# Altium footprint library ZLS_Lib.PcbLib: 157 footprints (part 7 of 10)
Each footprint in its own frame and in the unit in brackets; x right, y up, seen from the top. Pads: shape width x height; smd on the part's side, far side on the other; paste and mask are expansions set on the pad; w line width, h text height; cw(c..) or ccw(c..) is an arc to the next point about the centre after c.
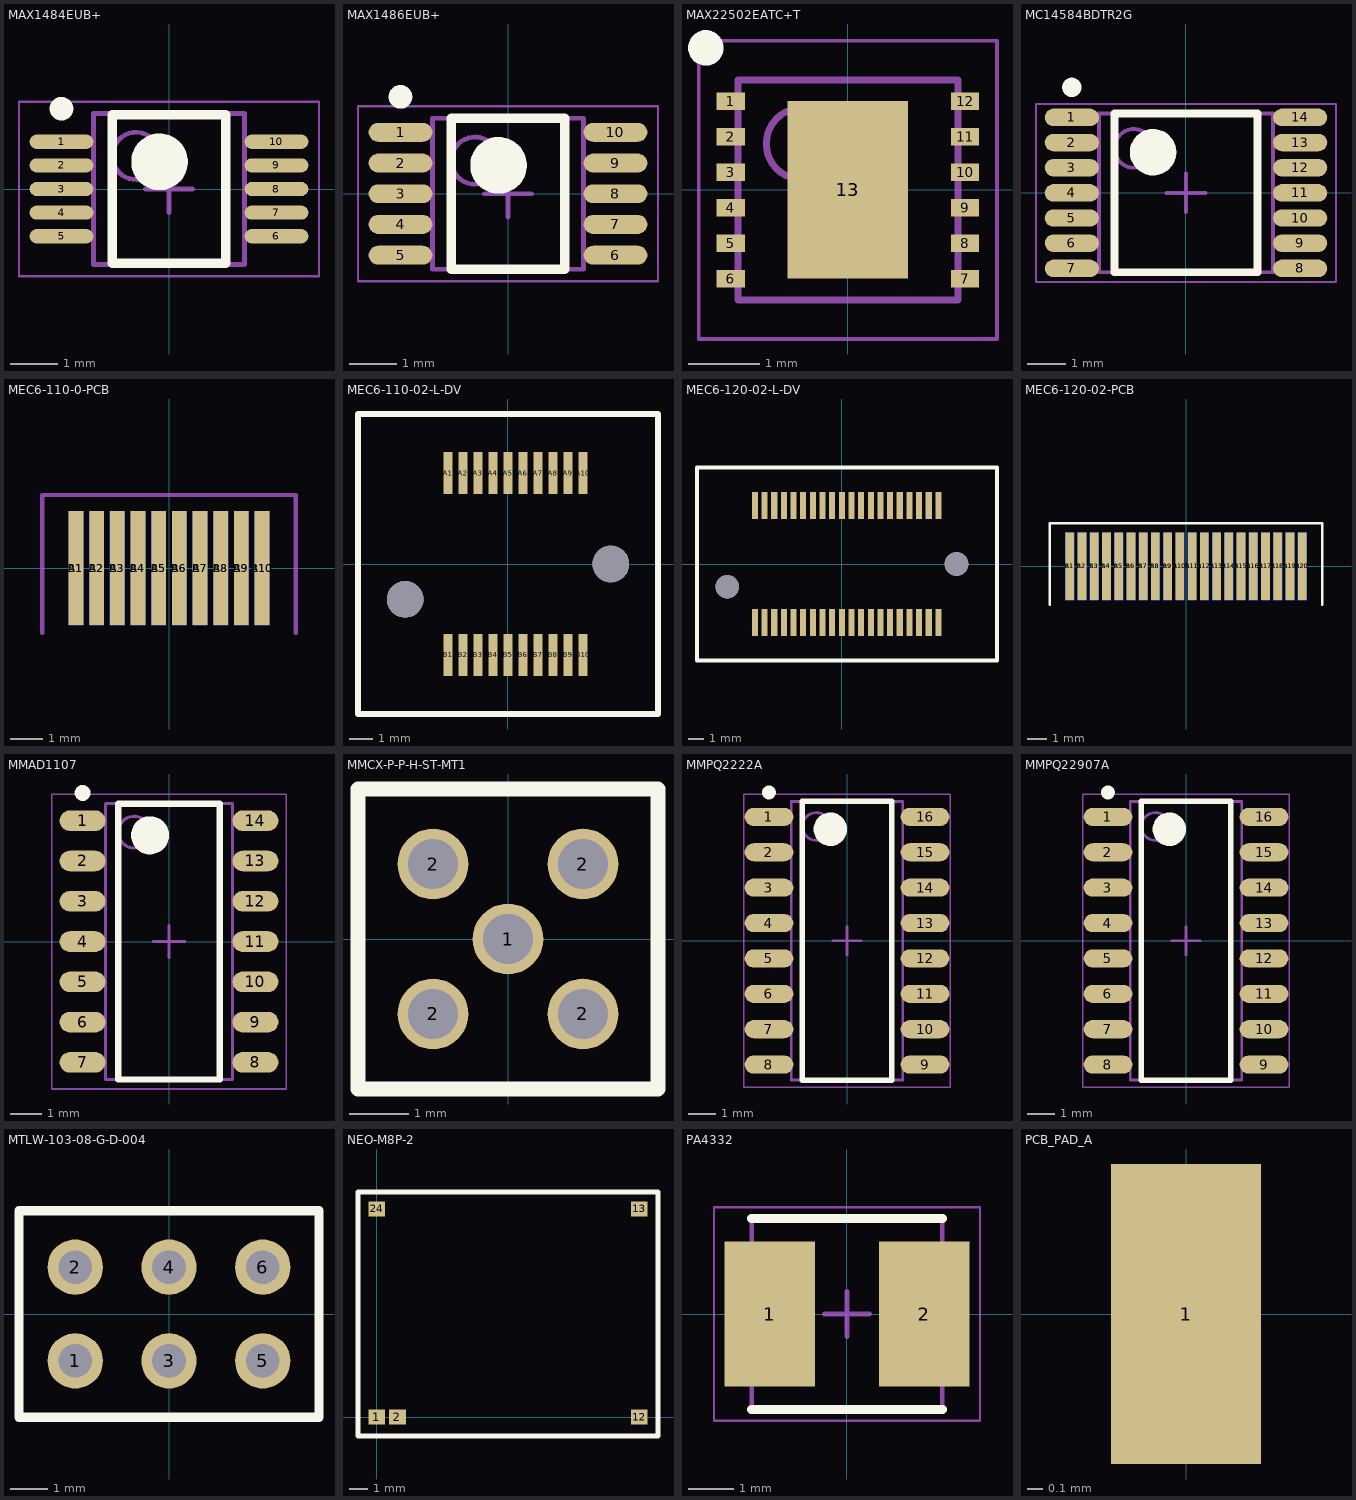
[diagram p6: the footprints below, top view; thin cyan lines are the x and y axes]

## MAX1484EUB+ [mm]
height 1.1
pads (10):
  oval 1.35x0.3 smd: 1(-2.275,1) 2(-2.275,0.5) 3(-2.275,0) 4(-2.275,-0.5) 5(-2.275,-1) 6(2.275,-1) 7(2.275,-0.5) 8(2.275,0) 9(2.275,0.5) 10(2.275,1)
Top Overlay:
  circle w0.6: c-0.2,0.575 r0.3
  circle w0.25: c-2.275,1.7 r0.125
  lines w0.2: -1.2,-1.575 1.2,-1.575 1.2,1.575 -1.2,1.575 -1.2,-1.575
Mechanical 13:
  circle w0.1: c-0.7,0.7 r0.5
  lines w0.1: -1.6,-1.6 1.6,-1.6 1.6,1.6 -1.6,1.6 -1.6,-1.6
Mechanical 15:
  lines w0.05: -3.175,-1.85 3.175,-1.85 3.175,1.85 -3.175,1.85 -3.175,-1.85
  lines w0.1: -0.5,0 0.5,0 ; 0,-0.5 0,0.5
3D body "MAX1484EUB+.step": height 1.09, standoff 0, extent -2.451,-1.6 2.451,1.6

## MAX1486EUB+ [mm]
height 1.1
pads (10):
  oval 1.35x0.4 smd: 1(-2.275,1.3) 2(-2.275,0.65) 3(-2.275,0) 4(-2.275,-0.65) 5(-2.275,-1.3) 6(2.275,-1.3) 7(2.275,-0.65) 8(2.275,0) 9(2.275,0.65) 10(2.275,1.3)
Top Overlay:
  circle w0.25: c-2.275,2.05 r0.125
  circle w0.6: c-0.2,0.6 r0.3
  lines w0.2: -1.2,-1.6 -1.2,1.6 1.2,1.6 1.2,-1.6 -1.2,-1.6
Mechanical 13:
  circle w0.1: c-0.7,0.7 r0.5
  lines w0.1: -1.6,-1.6 -1.6,1.6 1.6,1.6 1.6,-1.6 -1.6,-1.6
Mechanical 15:
  lines w0.05: -3.175,-1.85 -3.175,1.85 3.175,1.85 3.175,-1.85 -3.175,-1.85
  lines w0.1: -0.5,0 0.5,0 ; 0,-0.5 0,0.5
3D body "MAX1486EUB+.step": height 1.09, standoff 0, extent -2.451,-1.6 2.451,1.6

## MAX22502EATC+T [mm]
height 0.8
pads (13):
  rect 0.4x0.25 smd: 1(-1.65,1.25) 2(-1.65,0.75) 3(-1.65,0.25) 4(-1.65,-0.25) 5(-1.65,-0.75) 6(-1.65,-1.25) 7(1.65,-1.25) 8(1.65,-0.75) 9(1.65,-0.25) 10(1.65,0.25) 11(1.65,0.75) 12(1.65,1.25)
  rect 1.7x2.5 smd: 13(0,0)
Top Overlay:
  circle w0.25: c-2,2 r0.125
Mechanical 13:
  circle w0.1: c-0.65,0.65 r0.5
  lines w0.1: -1.55,-1.55 1.55,-1.55 1.55,1.55 -1.55,1.55 -1.55,-1.55
Mechanical 15:
  lines w0.05: -2.1,-2.1 2.1,-2.1 2.1,2.1 -2.1,2.1 -2.1,-2.1
  lines w0.1: -0.5,0 0.5,0 ; 0,-0.5 0,0.5
3D body "MAX22502EATC+T.step": height 0.8, standoff 0, extent -1.6,-1.55 1.6,1.55

## MC14584BDTR2G [mm]
height 1.2
pads (14):
  oval 1.4x0.45 smd: 1(-2.95,1.95) 2(-2.95,1.3) 3(-2.95,0.65) 4(-2.95,0) 5(-2.95,-0.65) 6(-2.95,-1.3) 7(-2.95,-1.95) 8(2.95,-1.95) 9(2.95,-1.3) 10(2.95,-0.65) 11(2.95,0) 12(2.95,0.65) 13(2.95,1.3) 14(2.95,1.95)
Top Overlay:
  circle w0.25: c-2.95,2.725 r0.125
  circle w0.6: c-0.85,1.05 r0.3
  lines w0.2: -1.85,-2.05 -1.85,2.05 1.85,2.05 1.85,-2.05 -1.85,-2.05
Mechanical 13:
  circle w0.1: c-1.35,1.15 r0.5
  lines w0.1: -2.25,-2.05 -2.25,2.05 2.25,2.05 2.25,-2.05 -2.25,-2.05
Mechanical 15:
  lines w0.05: -3.875,-2.3 -3.875,2.3 3.875,2.3 3.875,-2.3 -3.875,-2.3
  lines w0.1: -0.5,0 0.5,0 ; 0,-0.5 0,0.5
3D body "MC14584BDTR2G.step": height 1.2, standoff 0, extent -3.2,-2.073 3.2,2.073

## MEC6-110-0-PCB [mm]
pads (20):
  rect 0.45x3.5 smd: A1(-2.857,0) A2(-2.222,0) A3(-1.587,0) A4(-0.953,0) A5(-0.318,0) A6(0.318,0) A7(0.953,0) A8(1.587,0) A9(2.222,0) A10(2.857,0)
  rect 0.45x3.5 smd far side: B1(-2.857,0) B2(-2.222,0) B3(-1.587,0) B4(-0.953,0) B5(-0.318,0) B6(0.318,0) B7(0.953,0) B8(1.587,0) B9(2.222,0) B10(2.857,0)
Mechanical 1:
  lines w0.127: -3.894,-2 -3.894,2.25 3.894,2.25 3.894,-2

## MEC6-110-02-L-DV [mm] "Edge Connector Socket"
pads (22):
  rect 0.399x1.781 smd: A1(-2.54,3.85) A2(-1.905,3.85) A3(-1.27,3.85) A4(-0.635,3.85) A5(0,3.85) A6(0.635,3.85) A7(1.27,3.85) A8(1.905,3.85) A9(2.54,3.85) A10(3.175,3.85) B1(-2.54,-3.85) B2(-1.905,-3.85) B3(-1.27,-3.85) B4(-0.635,-3.85) B5(0,-3.85) B6(0.635,-3.85) B7(1.27,-3.85) B8(1.905,-3.85) B9(2.54,-3.85) B10(3.175,-3.85)
  round 1.55 hole 1.55: ""(-4.356,-1.5) ""(4.356,0)
Top Overlay:
  lines w0.254: -6.35,-6.35 6.35,-6.35 6.35,6.35 -6.35,6.35 -6.35,5.08 -6.35,-6.35
3D body "_MEC6_110_02_L_DV_terminal_2.sldprt": height 8.5, standoff 0, extent -5.202,-3.647 5.918,3.353
3D body "_MEC6_DV_C_182_02_10_pin_4.sldprt": height 7.09, standoff 0, extent -2.603,-4.394 3.315,4.406

## MEC6-120-02-L-DV [mm]
height 8.651
pads (42):
  rect 0.399x1.781 smd: A1(-5.719,3.85) A2(-5.084,3.85) A3(-4.449,3.85) A4(-3.814,3.85) A5(-3.179,3.85) A6(-2.544,3.85) A7(-1.909,3.85) A8(-1.274,3.85) A9(-0.639,3.85) A10(-0.004,3.85) A10(0.631,3.85) A11(1.266,3.85) A12(1.901,3.85) A13(2.536,3.85) A14(3.171,3.85) A15(3.806,3.85) A16(4.441,3.85) A17(5.076,3.85) A18(5.711,3.85) A19(6.346,3.85) B1(-5.719,-3.85) B2(-5.084,-3.85) B3(-4.449,-3.85) B4(-3.814,-3.85) B5(-3.179,-3.85) B6(-2.544,-3.85) B7(-1.909,-3.85) B8(-1.274,-3.85) B9(-0.639,-3.85) B10(-0.004,-3.85) B10(0.631,-3.85) B11(1.266,-3.85) B12(1.901,-3.85) B13(2.536,-3.85) B14(3.171,-3.85) B15(3.806,-3.85) B16(4.441,-3.85) B17(5.076,-3.85) B18(5.711,-3.85) B19(6.346,-3.85)
  round 1.55 hole 1.55: ""(-7.535,-1.5) ""(7.535,0)
Top Overlay:
  lines w0.254: -9.529,-6.35 -9.529,5.08 -9.529,6.35 10.201,6.35 10.201,-6.35 -9.529,-6.35
3D body "_MEC6_DV_C_182_02_20_pin_4.sldprt": height 7.09, standoff 0, extent -6.134,-4.4 6.134,4.4
3D body "_MEC6_120_02_L_DV_terminal_2.sldprt": height 8.5, standoff 0, extent -8.735,-3.5 8.735,3.5

## MEC6-120-02-PCB [mm]
pads (40):
  rect 0.45x3.5 smd: A1(-6.032,0) A2(-5.397,0) A3(-4.763,0) A4(-4.127,0) A5(-3.492,0) A6(-2.857,0) A7(-2.222,0) A8(-1.587,0) A9(-0.953,0) A10(-0.318,0) A11(0.318,0) A12(0.953,0) A13(1.587,0) A14(2.222,0) A15(2.857,0) A16(3.492,0) A17(4.127,0) A18(4.763,0) A19(5.397,0) A20(6.032,0)
  rect 0.45x3.5 smd far side: B1(-6.032,0) B2(-5.397,0) B3(-4.763,0) B4(-4.127,0) B5(-3.492,0) B6(-2.857,0) B7(-2.222,0) B8(-1.587,0) B9(-0.953,0) B10(-0.318,0) B11(0.318,0) B12(0.953,0) B13(1.587,0) B14(2.222,0) B15(2.857,0) B16(3.492,0) B17(4.127,0) B18(4.763,0) B19(5.397,0) B20(6.032,0)
Top Overlay:
  lines w0.127: -7.073,-2 -7.073,2.25 ; -7.069,2.25 7.073,2.25 7.073,-2

## MMAD1107 [mm] "SOIC, 14-Leads, Body 8.63x3.91mm, Pitch 1.27mm, IPC Medium Density"
height 1.75
pads (14):
  oval 1.45x0.65 smd: 1(-2.725,3.81) 2(-2.725,2.54) 3(-2.725,1.27) 4(-2.725,0) 5(-2.725,-1.27) 6(-2.725,-2.54) 7(-2.725,-3.81) 8(2.725,-3.81) 9(2.725,-2.54) 10(2.725,-1.27) 11(2.725,0) 12(2.725,1.27) 13(2.725,2.54) 14(2.725,3.81)
Top Overlay:
  circle w0.25: c-2.725,4.685 r0.125
  circle w0.6: c-0.6,3.35 r0.3
  lines w0.2: -1.6,-4.35 -1.6,4.35 1.6,4.35 1.6,-4.35 -1.6,-4.35
Mechanical 13:
  circle w0.1: c-1.1,3.45 r0.5
  lines w0.1: -2,-4.35 -2,4.35 2,4.35 2,-4.35 -2,-4.35
Mechanical 15:
  lines w0.05: -3.7,-4.65 -3.7,4.65 3.7,4.65 3.7,-4.65 -3.7,-4.65
  lines w0.1: -0.5,0 0.5,0 ; 0,-0.5 0,0.5
3D body "MMAD1107.step": height 1.75, standoff 0, extent -2.995,-4.35 2.995,4.35

## MMCX-P-P-H-ST-MT1 [mm]
pads (5):
  round 1.2 hole 0.84: 1(0,0) 2(-1.27,-1.27) 2(-1.27,1.27) 2(1.27,-1.27) 2(1.27,1.27)
Top Overlay:
  lines w0.254: -2.54,-2.54 -2.54,2.54 2.54,2.54 2.54,-2.54 -2.54,-2.54
3D body "_GRF1_P_P_04_E_ST_TH1_i_6.sldprt": height 3.25, standoff 0.25, extent -1.16,-1.16 1.16,1.16
3D body "_GRF1_P_P_04_E_ST_TH1_sh_4.sldprt": height 4.5, standoff -2.8, extent -1.75,-1.75 1.75,1.75
3D body "_GRF1_P_P_04_E_ST_TH1_p_8.sldprt": height 4.5, standoff -2.8, extent -0.425,-0.425 0.425,0.425

## MMPQ2222A [mm]
height 1.75
pads (16):
  oval 1.75x0.65 smd: 1(-2.8,4.445) 2(-2.8,3.175) 3(-2.8,1.905) 4(-2.8,0.635) 5(-2.8,-0.635) 6(-2.8,-1.905) 7(-2.8,-3.175) 8(-2.8,-4.445) 9(2.8,-4.445) 10(2.8,-3.175) 11(2.8,-1.905) 12(2.8,-0.635) 13(2.8,0.635) 14(2.8,1.905) 15(2.8,3.175) 16(2.8,4.445)
Top Overlay:
  circle w0.25: c-2.8,5.32 r0.125
  circle w0.6: c-0.6,4 r0.3
  lines w0.2: -1.6,-5 -1.6,5 1.6,5 1.6,-5 -1.6,-5
Mechanical 13:
  circle w0.1: c-1.1,4.1 r0.5
  lines w0.1: -2,-5 -2,5 2,5 2,-5 -2,-5
Mechanical 15:
  lines w0.05: -3.7,-5.25 -3.7,5.25 3.7,5.25 3.7,-5.25 -3.7,-5.25
  lines w0.1: -0.5,0 0.5,0 ; 0,-0.5 0,0.5
3D body: height 1.75, standoff 0.18, extent -2,-5 2,5

## MMPQ22907A [mm]
height 1.75
pads (16):
  oval 1.75x0.65 smd: 1(-2.8,4.445) 2(-2.8,3.175) 3(-2.8,1.905) 4(-2.8,0.635) 5(-2.8,-0.635) 6(-2.8,-1.905) 7(-2.8,-3.175) 8(-2.8,-4.445) 9(2.8,-4.445) 10(2.8,-3.175) 11(2.8,-1.905) 12(2.8,-0.635) 13(2.8,0.635) 14(2.8,1.905) 15(2.8,3.175) 16(2.8,4.445)
Top Overlay:
  circle w0.6: c-0.6,4 r0.3
  circle w0.25: c-2.8,5.32 r0.125
  lines w0.2: -1.6,-5 1.6,-5 1.6,5 -1.6,5 -1.6,-5
Mechanical 13:
  circle w0.1: c-1.1,4.1 r0.5
  lines w0.1: -2,-5 2,-5 2,5 -2,5 -2,-5
Mechanical 15:
  lines w0.05: -3.7,-5.25 3.7,-5.25 3.7,5.25 -3.7,5.25 -3.7,-5.25
  lines w0.1: -0.5,0 0.5,0 ; 0,-0.5 0,0.5
3D body: height 1.75, standoff 0.18, extent -2,-5 2,5

## MTLW-103-08-G-D-004 [mm]
height 3
pads (6):
  round 1.5 hole 0.91: 1(-2.54,-1.27) 2(-2.54,1.27) 3(0,-1.27) 4(0,1.27) 5(2.54,-1.27) 6(2.54,1.27)
Top Overlay:
  lines w0.254: -4.064,-2.794 4.064,-2.794 4.064,2.794 -4.064,2.794 -4.064,-2.794
3D body "_MTLW_03_08_D_004_4.sldprt": height 12.2, standoff -1.26, extent -2.984,-1.714 2.985,1.715
3D body "_MTLW_103_08_G_D_004_body_2.sldprt": height 1.52, standoff 0, extent -3.81,-2.514 3.81,2.515

## NEO-M8P-2 [mm]
height 2.4
pads (5):
  rect 0.9x0.8 smd: 1(0,0) 2(1.1,0) 12(14,0) 13(14,11.1) 24(0,11.1)
Top Overlay:
  lines w0.254: -1,-1 -1,12 15,12 15,-1 -1,-1
3D body: height 2.4, standoff 0, extent -1.127,-1.127 15.127,12.127
3D body: height 2.4, standoff 0, extent -1.127,-1.127 15.127,12.127
3D body: height 2.4, standoff 0, extent -0.999,-0.999 14.999,11.999
3D body: height 2.4, standoff 0, extent -0.552,-0.502 14.552,11.602

## PA4332 [mm] "Precision Wire Wound Inductor, 2-Leads, Body 4.10x3.65mm, IPC Medium Density"
height 2
pads (2):
  rect 2x3.2 smd: 1(-1.7,0) 2(1.7,0)
Top Overlay:
  lines w0.2: -2.1,-2.1 2.1,-2.1 ; -2.1,2.1 2.1,2.1
Mechanical 13:
  lines w0.1: -2.1,-2.1 2.1,-2.1 2.1,2.1 -2.1,2.1 -2.1,-2.1
Mechanical 15:
  lines w0.05: -2.925,-2.35 2.925,-2.35 2.925,2.35 -2.925,2.35 -2.925,-2.35
  lines w0.1: -0.5,0 0.5,0 ; 0,-0.5 0,0.5
3D body "PA4332.step": height 2.1, standoff 0, extent -2.15,-1.825 2.15,1.825

## PCB_PAD_A [mm]
pads (1):
  rect 1x2 smd: 1(0,0)